# Altium footprint library lib_datalogger.PcbLib: 866 footprints (part 50 of 55)
Each footprint in its own frame and in the unit in brackets; x right, y up, seen from the top. Pads: shape width x height; smd on the part's side, far side on the other; paste and mask are expansions set on the pad; w line width, h text height; cw(c..) or ccw(c..) is an arc to the next point about the centre after c.
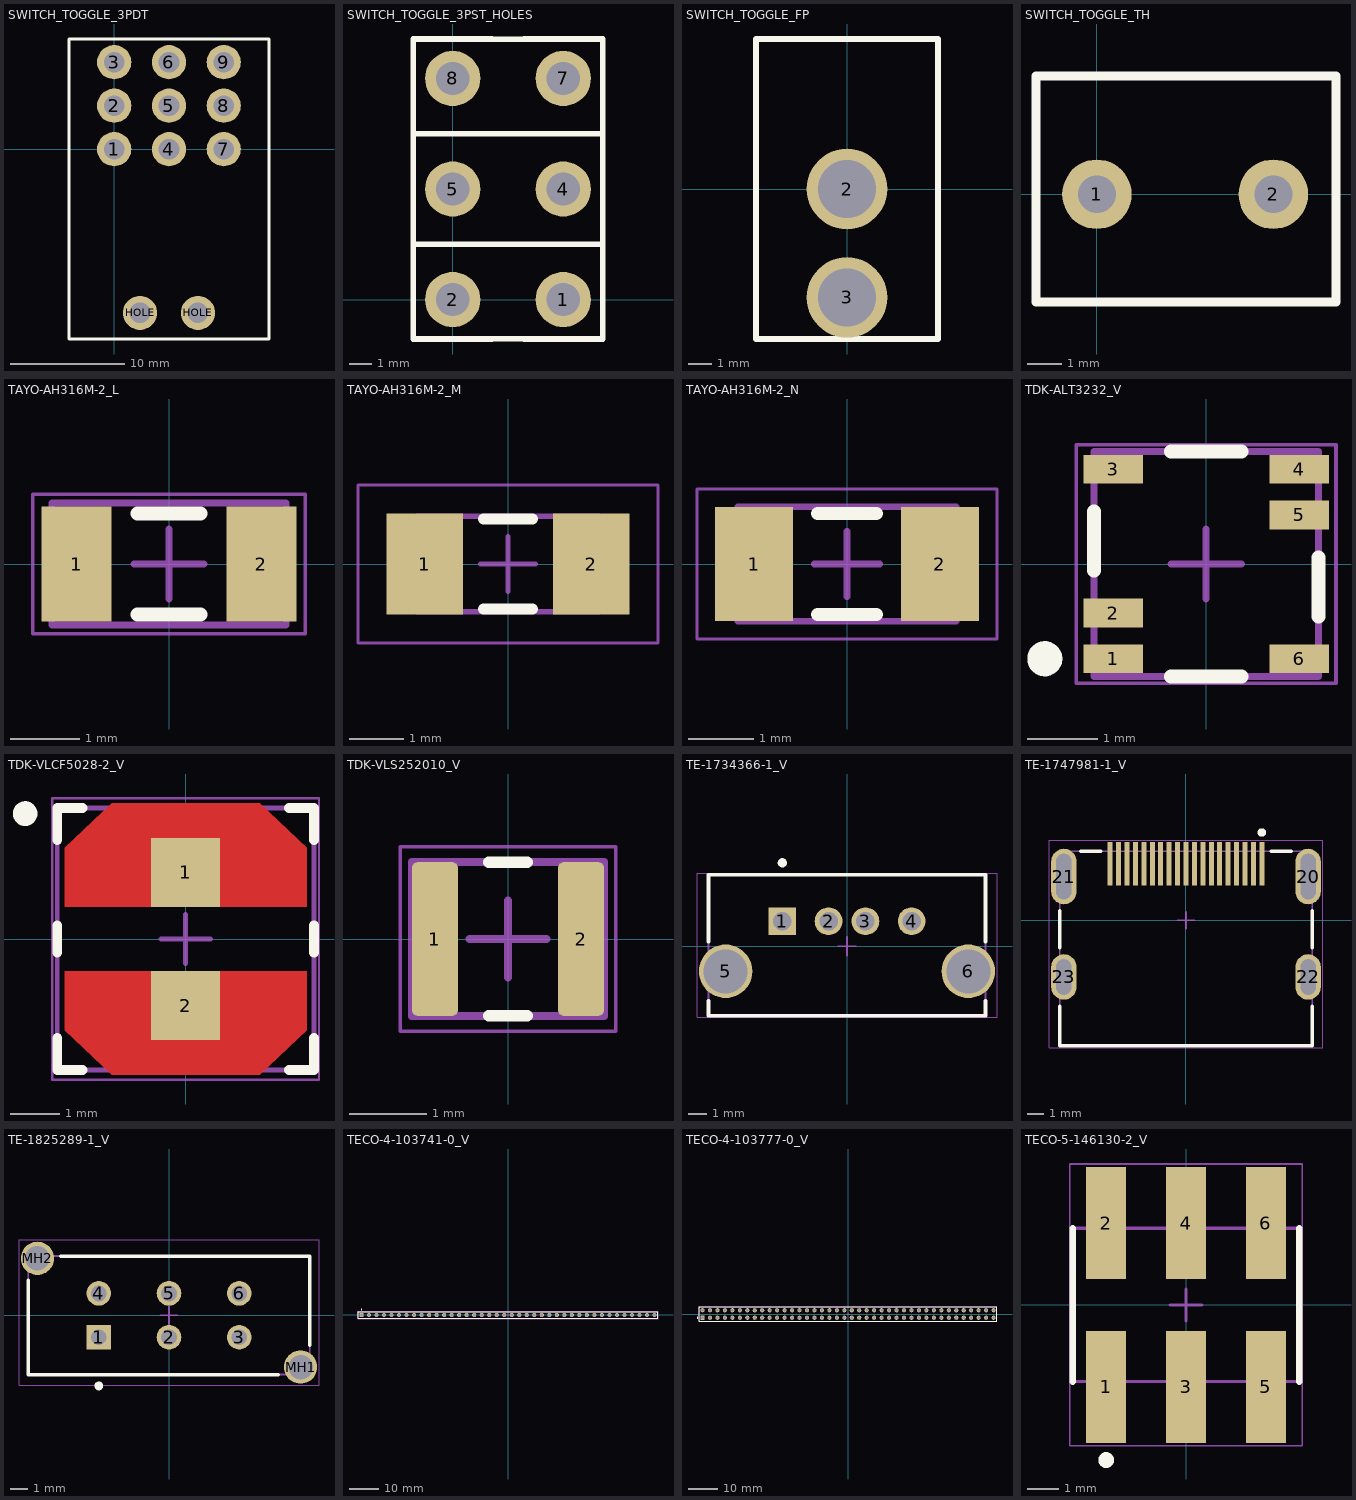
[diagram p49: the footprints below, top view; thin cyan lines are the x and y axes]

## SWITCH_TOGGLE_3PDT [mm]
pads (11):
  round 3 hole 1.8: 1(0,0) 2(0,3.81) 3(0,7.62) 4(4.8,0) 5(4.8,3.81) 6(4.8,7.62) 7(9.6,0) 8(9.6,3.81) 9(9.6,7.62) HOLE(2.26,-14.35) HOLE(7.34,-14.35)
Top Overlay:
  lines w0.254: -3.95,-16.637 -3.95,9.652 13.551,9.652 13.551,-16.637 -3.95,-16.637
3D body "M2032S2A2G40.stp": height 13.5, standoff -2.89, extent -3.95,-28.076 13.551,7.976

## SWITCH_TOGGLE_3PST_HOLES [mm]
pads (6):
  round 2.5 hole 1.5: 1(5,0) 2(0,0) 4(5,5) 5(0,5) 7(5,10) 8(0,10)
Top Overlay:
  lines w0.254: -1.782,-1.778 6.782,-1.778 ; -1.782,11.778 6.782,11.778 ; -1.778,11.778 -1.778,-1.782 1.778,-1.782 ; -1.778,11.782 1.778,11.782 ; -1.727,2.5 6.778,2.5 ; -1.727,7.5 6.778,7.5 ; 3.222,-1.782 6.778,-1.782 6.778,11.778 ; 3.222,11.782 6.778,11.782

## SWITCH_TOGGLE_FP [mm]
pads (2):
  round 3.5 hole 2.5: 2(0,0) 3(0,-4.7)
Top Overlay:
  lines w0.254: -3.95,-6.5 -3.95,6.5 3.95,6.5 3.95,-6.5 -3.95,-6.5
3D body "M2011SS1W01.stp": height 29.38, standoff -4.17, extent -5.993,-6.502 5.993,6.502

## SWITCH_TOGGLE_TH [mm]
pads (2):
  round 2 hole 1.09: 1(0,0) 2(5.08,0)
Top Overlay:
  lines w0.254: -1.753,-3.099 6.883,-3.099 6.883,3.404 -1.753,3.404 -1.753,-3.099
3D body "c-2267078-1-a-3d.stp": height 22, standoff -3.15, extent -1.499,-2.845 6.629,3.15

## TAYO-AH316M-2_L [mm] "Chip, 2-Leads, Body 3.35x1.75mm, IPC High Density"
height 0.6
pads (2):
  rect 1x1.65 smd: 1(-1.325,0) 2(1.325,0)
Top Overlay:
  lines w0.2: -0.45,-0.725 0.45,-0.725 ; -0.45,0.725 0.45,0.725
Mechanical 13:
  lines w0.1: -1.675,-0.875 1.675,-0.875 1.675,0.875 -1.675,0.875 -1.675,-0.875
Mechanical 15:
  lines w0.05: -1.95,-1 1.95,-1 1.95,1 -1.95,1 -1.95,-1
  lines w0.1: -0.5,0 0.5,0 ; 0,-0.5 0,0.5
3D body "User Library-AH316M.STEP": height 0.58, standoff -0.02, extent -1.65,-0.8 1.65,0.8

## TAYO-AH316M-2_M [mm] "Chip, 2-Leads, Body 3.35x1.75mm, IPC Low Density"
height 0.6
pads (2):
  rect 1.4x1.85 smd: 1(-1.525,0) 2(1.525,0)
Top Overlay:
  lines w0.2: -0.45,-0.825 0.45,-0.825 ; -0.45,0.825 0.45,0.825
Mechanical 13:
  lines w0.1: -1.675,-0.875 1.675,-0.875 1.675,0.875 -1.675,0.875 -1.675,-0.875
Mechanical 15:
  lines w0.05: -2.75,-1.45 2.75,-1.45 2.75,1.45 -2.75,1.45 -2.75,-1.45
  lines w0.1: -0.5,0 0.5,0 ; 0,-0.5 0,0.5
3D body "User Library-AH316M.STEP": height 0.58, standoff -0.02, extent -1.65,-0.8 1.65,0.8

## TAYO-AH316M-2_N [mm] "Chip, 2-Leads, Body 3.35x1.75mm, IPC Medium Density"
height 0.6
pads (2):
  rect 1.2x1.75 smd: 1(-1.425,0) 2(1.425,0)
Top Overlay:
  lines w0.2: -0.45,-0.775 0.45,-0.775 ; -0.45,0.775 0.45,0.775
Mechanical 13:
  lines w0.1: -1.675,-0.875 -1.675,0.875 1.675,0.875 1.675,-0.875 -1.675,-0.875
Mechanical 15:
  lines w0.05: -2.3,-1.15 -2.3,1.15 2.3,1.15 2.3,-1.15 -2.3,-1.15
  lines w0.1: -0.5,0 0.5,0 ; 0,-0.5 0,0.5
3D body "User Library-AH316M.STEP": height 0.58, standoff -0.02, extent -1.65,-0.8 1.65,0.8

## TDK-ALT3232_V [mm] "SMD, 6-Leads, Body 3.2x3.2mm"
height 2.9
pads (6):
  rect 0.85x0.41 smd: 1(-1.325,-1.35) 2(-1.325,-0.7) 3(-1.325,1.35) 4(1.325,1.35) 5(1.325,0.7) 6(1.325,-1.35)
Top Overlay:
  circle w0.25: c-2.3,-1.35 r0.125
  lines w0.2: -1.6,-0.095 -1.6,0.745 ; -0.503,-1.6 0.503,-1.6 ; -0.503,1.6 0.503,1.6 ; 1.6,-0.745 1.6,0.095
Mechanical 13:
  lines w0.1: -1.6,-1.6 1.6,-1.6 1.6,1.6 -1.6,1.6 -1.6,-1.6
Mechanical 15:
  lines w0.05: -1.85,-1.7 -1.85,1.7 1.85,1.7 1.85,-1.7 -1.85,-1.7
  lines w0.1: -0.5,0 0.5,0 ; 0,-0.5 0,0.5
3D body: height 2.9, standoff 0, extent -1.6,-1.6 1.6,1.6

## TDK-VLCF5028-2_V [mm] "SMD, 2-Leads, Body 5.2x5.3mm"
height 2.8
pads (2):
  rect 1.4x1.4 smd: 1(0,1.35) 2(0,-1.35)
Top Layer:
  region: -2.45,-0.65 2.45,-0.65 2.45,-1.85 1.5,-2.75 -1.5,-2.75 -2.45,-1.85
  region: -2.45,0.65 -2.45,1.85 -1.5,2.75 1.5,2.75 2.45,1.85 2.45,0.65
Top Overlay:
  circle w0.25: c-3.25,2.54 r0.125
  lines w0.2: -2.6,-2.005 -2.6,-2.65 -2.089,-2.65 ; -2.6,-0.279 -2.6,0.279 ; -2.6,2.005 -2.6,2.65 -2.089,2.65 ; 2.089,-2.65 2.6,-2.65 2.6,-2.005 ; 2.089,2.65 2.6,2.65 2.6,2.005 ; 2.6,-0.279 2.6,0.279
Mechanical 13:
  lines w0.1: -2.6,-2.65 2.6,-2.65 2.6,2.65 -2.6,2.65 -2.6,-2.65
Mechanical 15:
  lines w0.05: -2.7,-2.85 2.7,-2.85 2.7,2.85 -2.7,2.85 -2.7,-2.85
  lines w0.1: -0.5,0 0.5,0 ; 0,-0.5 0,0.5
3D body: height 2.8, standoff 0, extent -2.6,-2.65 2.6,2.65

## TDK-VLS252010_V [mm] "SMD, 2-Leads, Body 2.5x2mm"
height 1
pads (2):
  rrect25% 0.6x2 smd: 1(-0.95,0) 2(0.95,0)
Top Overlay:
  lines w0.15: -0.25,-1 0.25,-1 ; -0.25,1 0.25,1
Mechanical 13:
  lines w0.1: -1.25,-1 -1.25,1 1.25,1 1.25,-1 -1.25,-1
Mechanical 15:
  lines w0.05: -1.4,-1.2 1.4,-1.2 1.4,1.2 -1.4,1.2 -1.4,-1.2
  lines w0.1: -0.5,0 0.5,0 ; 0,-0.5 0,0.5
Top Designator:
  text ".Designator" at -1.27,-0.127 h0.6
3D body "IND_252010.STEP": height 1, standoff -0.01, extent -1.25,-1 1.25,1

## TE-1734366-1_V [mm] "Connector, 6-Leads, Body 7.62x15mm"
height 15
pads (6):
  rect 1.5x1.5 hole 1: 1(-3.5,1.355)
  round 1.5 hole 1: 2(-1,1.355) 3(1,1.355) 4(3.5,1.355)
  round 2.9 hole 2.38: 5(-6.57,-1.355) 6(6.57,-1.355)
Top Overlay:
  circle w0.25: c-3.5,4.515 r0.125
  lines w0.2: -7.5,-2.954 -7.5,-3.755 7.5,-3.755 7.5,-2.954 ; -7.5,0.244 -7.5,3.865 7.5,3.865 7.5,0.244
Mechanical 13:
  lines w0.1: -7.5,-3.755 -7.5,3.865 7.5,3.865 7.5,-3.755 -7.5,-3.755
Mechanical 15:
  lines w0.05: -8.12,-3.855 -8.12,3.965 8.12,3.965 8.12,-3.855 -8.12,-3.855
  lines w0.1: -0.5,0 0.5,0 ; 0,-0.5 0,0.5
3D body: height 15, standoff 0, extent -7.5,-3.755 7.5,3.865
3D body: height 0, standoff -2.8, extent -3.817,1.038 -3.182,1.673
3D body: height 0, standoff -2.8, extent -1.317,1.038 -0.682,1.673
3D body: height 0, standoff -2.8, extent 0.683,1.038 1.318,1.673
3D body: height 0, standoff -2.8, extent 3.183,1.038 3.818,1.673

## TE-1747981-1_V [mm] "Connector, 19-Leads, Body 11.55x15mm, Pitch 0.5mm"
height 6.38
pads (23):
  rect 0.3x2.6 smd: 1(4.5,3.36) 2(4,3.36) 3(3.5,3.36) 4(3,3.36) 5(2.5,3.36) 6(2,3.36) 7(1.5,3.36) 8(1,3.36) 9(0.5,3.36) 10(0,3.36) 11(-0.5,3.36) 12(-1,3.36) 13(-1.5,3.36) 14(-2,3.36) 15(-2.5,3.36) 16(-3,3.36) 17(-3.5,3.36) 18(-4,3.36) 19(-4.5,3.36)
  oval 1.5x3.3 hole 0.9 slot 2.7 at 90 deg: 20(7.25,2.6) 21(-7.25,2.6)
  oval 1.5x2.7 hole 0.9 slot 2.1 at 90 deg: 22(7.25,-3.36) 23(-7.25,-3.36)
Top Overlay:
  circle w0.25: c4.5,5.21 r0.125
  lines w0.2: -7.5,-5.09 -7.5,-7.45 7.5,-7.45 7.5,-5.09 ; -7.5,-1.627 -7.5,0.575 ; -6.26,4.1 -5.05,4.1 ; 5.05,4.1 6.26,4.1 ; 7.5,-1.627 7.5,0.575
Mechanical 13:
  lines w0.1: -7.5,-7.45 7.5,-7.45 7.5,4.1 -7.5,4.1 -7.5,-7.45
Mechanical 15:
  lines w0.05: -8.1,-7.55 8.1,-7.55 8.1,4.76 -8.1,4.76 -8.1,-7.55
  lines w0.1: -0.5,0 0.5,0 ; 0,-0.5 0,0.5
3D body "c-1747981-1-j-3d.stp": height 6.18, standoff -2.1, extent -7.5,-7.45 7.5,4.55

## TE-1825289-1_V [mm] "TH, 6-Leads, Body 16.05x6.75mm"
height 12.05
pads (8):
  rect 1.4x1.4 hole 0.9: 1(-4,-1.25)
  round 1.4 hole 0.9: 2(0,-1.25) 3(4,-1.25) 4(-4,1.25) 5(0,1.25) 6(4,1.25)
  round 1.9 hole 1.4: MH1(7.5,-2.95) MH2(-7.5,3.25)
Top Overlay:
  circle w0.25: c-4,-4.025 r0.125
  lines w0.2: -8.025,2.006 -8.025,-3.375 6.219,-3.375 ; -6.156,3.375 8.025,3.375 8.025,-1.706
Mechanical 13:
  lines w0.1: 3.988,3.363 4,3.375 ; -8.025,-3.375 8.025,-3.375 8.025,3.375 -8.025,3.375 -8.025,-3.375
Mechanical 15:
  lines w0.05: -8.55,-4 8.55,-4 8.55,4.3 -8.55,4.3 -8.55,-4
  lines w0.1: -0.5,0 0.5,0 ; 0,-0.5 0,0.5
3D body: height 12.05, standoff 0.5, extent -4,-1.5 0,1.5
3D body: height 3, standoff -2.5, extent 7.025,-3.375 8.025,-2.875
3D body: height 3, standoff -2.5, extent -8.025,2.875 -7.025,3.375
3D body: height 4, standoff -2.5, extent 3.75,1 4.25,1.5
3D body: height 4, standoff -2.5, extent -0.25,1 0.25,1.5
3D body: height 4, standoff -2.5, extent -4.25,1 -3.75,1.5
3D body: height 4, standoff -2.5, extent -4.25,-1.5 -3.75,-1
3D body: height 4, standoff -2.5, extent -0.25,-1.5 0.25,-1
3D body: height 4, standoff -2.5, extent 3.75,-1.52 4.25,-1.02
3D body: height 7, standoff 0.5, extent -4.025,-1.775 4.025,1.775
3D body: height 7.55, standoff 0.5, extent -8.025,-3.375 -4.025,3.375
3D body: height 7.55, standoff 0.5, extent -4.025,-3.375 4.025,-1.775
3D body: height 7.55, standoff 0.5, extent -4.025,1.775 4.025,3.375
3D body: height 7.55, standoff 0.5, extent 4.025,-3.375 8.025,3.375

## TECO-4-103741-0_V [mm] "THD, 40-Leads, Body 101.194x2.337mm, Pitch 2.54mm"
height 8.128
pads (40):
  rect 1.4x1.4 hole 0.889: 1(-49.53,0)
  round 1.4 hole 0.889: 2(-46.99,0) 3(-44.45,0) 4(-41.91,0) 5(-39.37,0) 6(-36.83,0) 7(-34.29,0) 8(-31.75,0) 9(-29.21,0) 10(-26.67,0) 11(-24.13,0) 12(-21.59,0) 13(-19.05,0) 14(-16.51,0) 15(-13.97,0) 16(-11.43,0) 17(-8.89,0) 18(-6.35,0) 19(-3.81,0) 20(-1.27,0) 21(1.27,0) 22(3.81,0) 23(6.35,0) 24(8.89,0) 25(11.43,0) 26(13.97,0) 27(16.51,0) 28(19.05,0) 29(21.59,0) 30(24.13,0) 31(26.67,0) 32(29.21,0) 33(31.75,0) 34(34.29,0) 35(36.83,0) 36(39.37,0) 37(41.91,0) 38(44.45,0) 39(46.99,0) 40(49.53,0)
Top Overlay:
  circle w0.25: c-49.53,1.818 r0.125
  lines w0.2: -50.597,-1.168 -50.597,1.168 50.597,1.168 50.597,-1.168 -50.597,-1.168
Mechanical 13:
  lines w0.1: -50.597,-1.168 -50.597,1.168 50.597,1.168 50.597,-1.168 -50.597,-1.168
Mechanical 15:
  lines w0.05: -50.697,-1.268 -50.697,1.268 50.697,1.268 50.697,-1.268 -50.697,-1.268
  lines w0.1: -0.5,0 0.5,0 ; 0,-0.5 0,0.5
3D body "c-4-103741-0-h-3d.stp": height 4.59, standoff -5.83, extent -50.597,-1.168 50.597,1.169

## TECO-4-103777-0_V [mm] "THD, 80-Leads, Body 101.19x4.88mm, Pitch 2.54mm"
height 8.13
pads (80):
  rect 1.4x1.4 hole 0.89: 1(-49.53,-1.27)
  round 1.4 hole 0.89: 2(-46.99,-1.27) 3(-44.45,-1.27) 4(-41.91,-1.27) 5(-39.37,-1.27) 6(-36.83,-1.27) 7(-34.29,-1.27) 8(-31.75,-1.27) 9(-29.21,-1.27) 10(-26.67,-1.27) 11(-24.13,-1.27) 12(-21.59,-1.27) 13(-19.05,-1.27) 14(-16.51,-1.27) 15(-13.97,-1.27) 16(-11.43,-1.27) 17(-8.89,-1.27) 18(-6.35,-1.27) 19(-3.81,-1.27) 20(-1.27,-1.27) 21(1.27,-1.27) 22(3.81,-1.27) 23(6.35,-1.27) 24(8.89,-1.27) 25(11.43,-1.27) 26(13.97,-1.27) 27(16.51,-1.27) 28(19.05,-1.27) 29(21.59,-1.27) 30(24.13,-1.27) 31(26.67,-1.27) 32(29.21,-1.27) 33(31.75,-1.27) 34(34.29,-1.27) 35(36.83,-1.27) 36(39.37,-1.27) 37(41.91,-1.27) 38(44.45,-1.27) 39(46.99,-1.27) 40(49.53,-1.27) 41(49.53,1.27) 42(46.99,1.27) 43(44.45,1.27) 44(41.91,1.27) 45(39.37,1.27) 46(36.83,1.27) 47(34.29,1.27) 48(31.75,1.27) 49(29.21,1.27) 50(26.67,1.27) 51(24.13,1.27) 52(21.59,1.27) 53(19.05,1.27) 54(16.51,1.27) 55(13.97,1.27) 56(11.43,1.27) 57(8.89,1.27) 58(6.35,1.27) 59(3.81,1.27) 60(1.27,1.27) 61(-1.27,1.27) 62(-3.81,1.27) 63(-6.35,1.27) 64(-8.89,1.27) 65(-11.43,1.27) 66(-13.97,1.27) 67(-16.51,1.27) 68(-19.05,1.27) 69(-21.59,1.27) 70(-24.13,1.27) 71(-26.67,1.27) 72(-29.21,1.27) 73(-31.75,1.27) 74(-34.29,1.27) 75(-36.83,1.27) 76(-39.37,1.27) 77(-41.91,1.27) 78(-44.45,1.27) 79(-46.99,1.27) 80(-49.53,1.27)
Top Overlay:
  circle w0.25: c-51.28,-1.27 r0.125
  lines w0.2: -50.63,-2.44 50.63,-2.44 50.63,2.44 -50.63,2.44 -50.63,-2.44
Mechanical 13:
  lines w0.1: -50.595,-2.44 50.595,-2.44 50.595,2.44 -50.595,2.44 -50.595,-2.44
Mechanical 15:
  lines w0.05: -50.695,-2.54 -50.695,2.54 50.695,2.54 50.695,-2.54 -50.695,-2.54
  lines w0.1: -0.5,0 0.5,0 ; 0,-0.5 0,0.5
3D body "c-4-103777-0-f-3d.stp": height 8.13, standoff -2.28, extent -50.6,-2.438 50.594,2.438

## TECO-5-146130-2_V [mm] "Header, 6-Leads, Body 7.21x4.88mm, Pitch 2.54mm"
height 9.73
pads (6):
  rect 1.27x3.56 smd: 1(-2.54,-2.605) 2(-2.54,2.605) 3(0,-2.605) 4(0,2.605) 5(2.54,-2.605) 6(2.54,2.605)
Top Overlay:
  circle w0.25: c-2.54,-4.935 r0.125
  lines w0.2: -3.605,-2.44 -3.605,2.44 ; 3.605,-2.44 3.605,2.44
Mechanical 13:
  lines w0.1: -3.605,-2.44 3.605,-2.44 3.605,2.44 -3.605,2.44 -3.605,-2.44
Mechanical 15:
  lines w0.05: -3.705,-4.485 3.705,-4.485 3.705,4.485 -3.705,4.485 -3.705,-4.485
  lines w0.1: -0.5,0 0.5,0 ; 0,-0.5 0,0.5
3D body "c-0146130-52-k-3d.stp": height 9.74, standoff 0.01, extent -3.607,-3.773 3.607,3.643